# Altium footprint library PcbLib1.PcbLib: 81 footprints (part 4 of 6)
Each footprint in its own frame and in the unit in brackets; x right, y up, seen from the top. Pads: shape width x height; smd on the part's side, far side on the other; paste and mask are expansions set on the pad; w line width, h text height; cw(c..) or ccw(c..) is an arc to the next point about the centre after c.
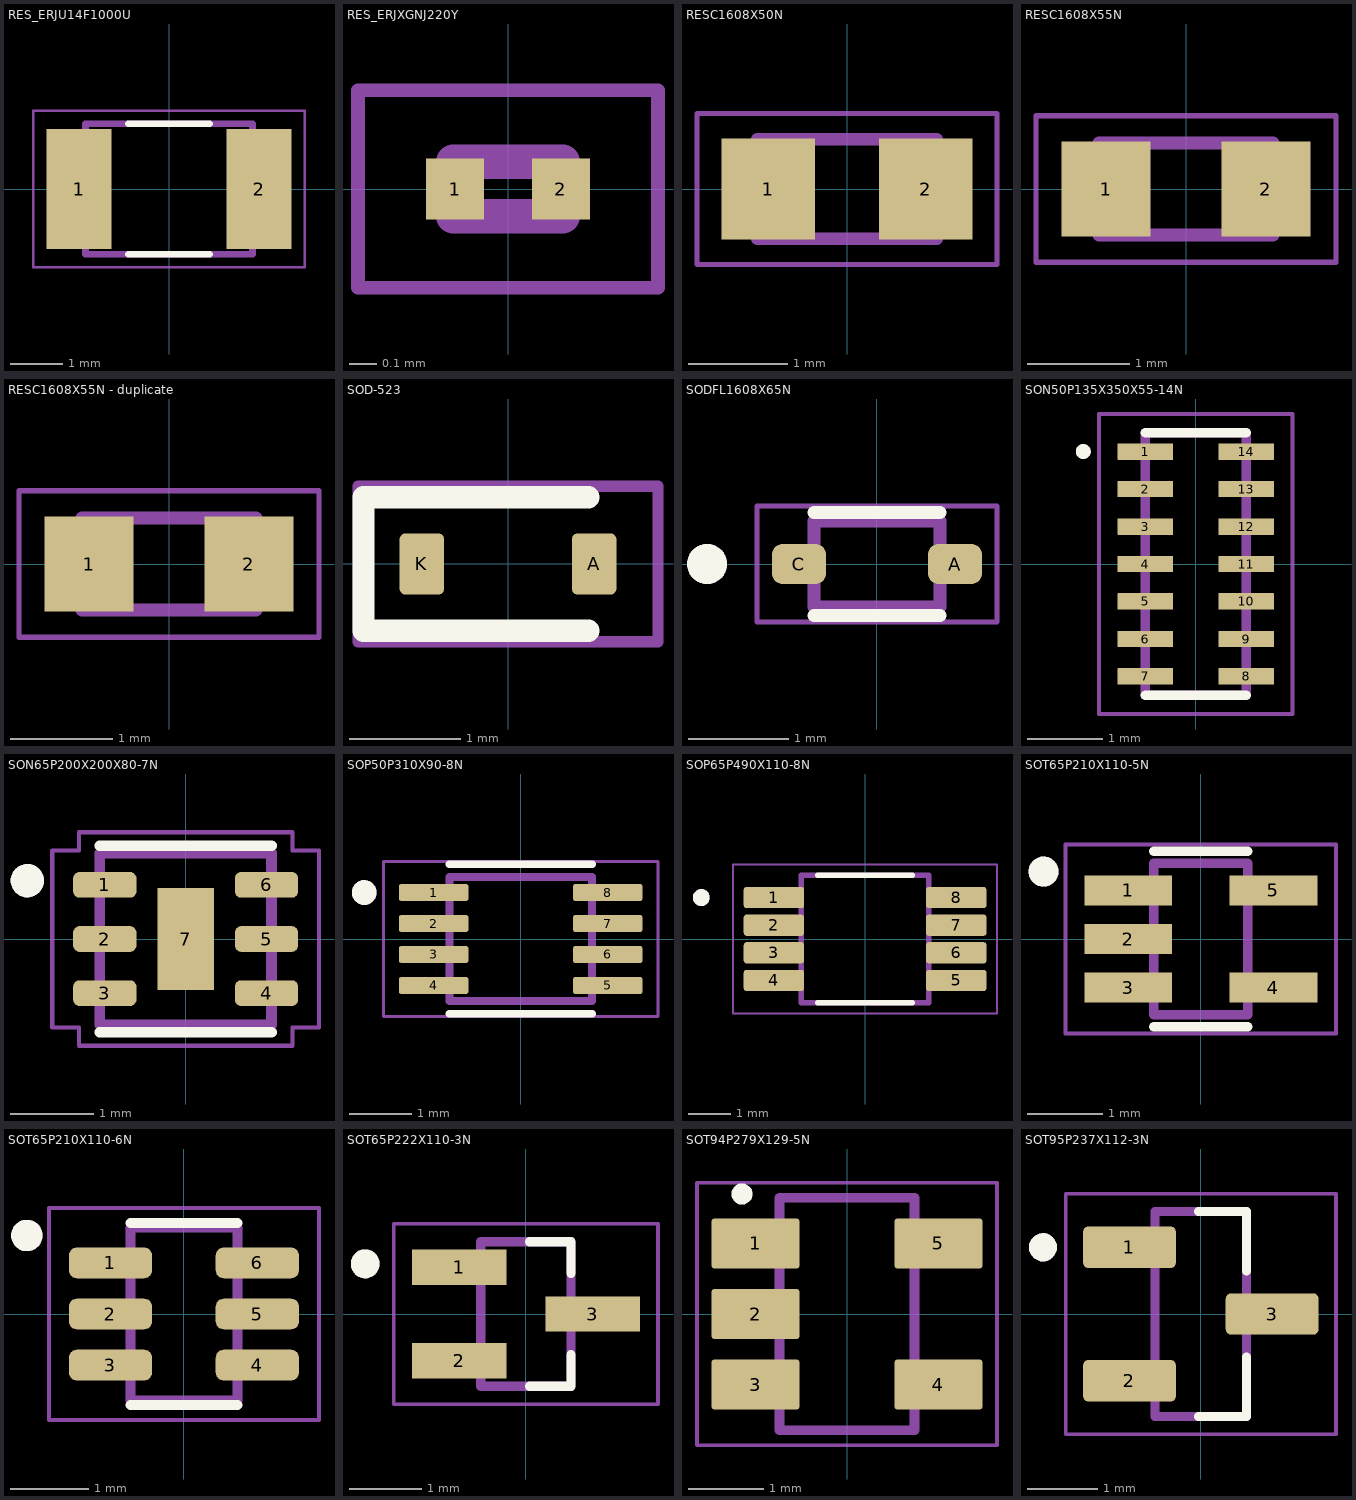
[diagram p3: the footprints below, top view; thin cyan lines are the x and y axes]

## RES_ERJU14F1000U [mm]
pads (2):
  rect 1.25x2.3 smd: 1(-1.725,0) 2(1.725,0)
Top Overlay:
  lines w0.127: -0.78,-1.25 0.78,-1.25 ; -0.78,1.25 0.78,1.25
Mechanical 13:
  lines w0.127: -1.6,-1.25 -1.6,1.25 1.6,1.25 1.6,-1.25 -1.6,-1.25
Mechanical 15:
  lines w0.05: -2.6,-1.5 -2.6,1.5 2.6,1.5 2.6,-1.5 -2.6,-1.5
3D body "ERJ-U14F1000U.STEP": height 0.6, standoff 0, extent -1.6,-1.25 1.6,1.25

## RES_ERJXGNJ220Y [mm]
pads (2):
  rect 0.212x0.225 smd: 1(-0.194,0) 2(0.194,0)
Mechanical 13:
  lines w0.127: -0.2,-0.1 0.2,-0.1 0.2,0.1 -0.2,0.1 -0.2,-0.1
Mechanical 15:
  lines w0.05: -0.55,-0.362 0.55,-0.362 0.55,0.362 -0.55,0.362 -0.55,-0.362
3D body "ERJ-XGNJ220Y.STEP": height 0.13, standoff 0, extent -0.206,-0.1 0.194,0.1

## RESC1608X50N [mm]
pads (2):
  rect 0.94x1.02 smd paste+0 mask+0.102: 1(-0.79,0) 2(0.79,0)
Mechanical 13:
  lines w0.127: -0.9,-0.5 0.9,-0.5 0.9,0.5 -0.9,0.5 -0.9,-0.5
Mechanical 15:
  lines w0.05: -1.508,-0.758 1.508,-0.758 1.508,0.758 -1.508,0.758 -1.508,-0.758
3D body "step_temp.STEP": height 0.5, standoff 0, extent -0.8,-0.4 0.8,0.4

## RESC1608X55N [mm]
pads (2):
  rect 0.87x0.93 smd: 1(-0.78,0) 2(0.78,0)
Mechanical 13:
  lines w0.127: -0.85,-0.45 0.85,-0.45 0.85,0.45 -0.85,0.45 -0.85,-0.45
Mechanical 15:
  lines w0.05: -1.465,-0.715 1.465,-0.715 1.465,0.715 -1.465,0.715 -1.465,-0.715
3D body "step_temp.STEP": height 0.55, standoff 0, extent -0.8,-0.4 0.8,0.4

## RESC1608X55N - duplicate [mm]
pads (2):
  rect 0.87x0.93 smd paste+0 mask+0.102: 1(-0.78,0) 2(0.78,0)
Mechanical 13:
  lines w0.127: -0.85,-0.45 0.85,-0.45 0.85,0.45 -0.85,0.45 -0.85,-0.45
Mechanical 15:
  lines w0.05: -1.465,-0.715 1.465,-0.715 1.465,0.715 -1.465,0.715 -1.465,-0.715
3D body "step_temp.STEP": height 0.55, standoff 0, extent -0.8,-0.4 0.8,0.4

## SOD-523 [mm] "SMD"
pads (2):
  rrect25% 0.4x0.55 smd: A(0.775,0) K(-0.775,0)
Top Overlay:
  lines w0.2: 0.725,-0.6 -1.3,-0.6 -1.3,0.6 0.725,0.6
Mechanical 15:
  lines w0.1: -1.35,-0.7 1.35,-0.7 1.35,0.7 -1.35,0.7 -1.35,-0.7
3D body "p38_SOD-523.stp": height 0.7, standoff 0, extent -0.85,-0.425 0.85,0.425

## SODFL1608X65N [mm]
pads (2):
  rrect50% 0.54x0.4 smd: A(0.78,0) C(-0.78,0)
Top Overlay:
  circle w0.2: c-1.7,0 r0.1
  lines w0.127: -0.63,-0.515 0.63,-0.515 ; -0.63,0.515 0.63,0.515
Mechanical 13:
  circle w0.2: c-1.7,0 r0.1
  lines w0.127: -0.63,-0.43 -0.63,0.43 0.63,0.43 0.63,-0.43 -0.63,-0.43
Mechanical 15:
  lines w0.05: -1.2,-0.58 -1.2,0.58 1.2,0.58 1.2,-0.58 -1.2,-0.58
3D body "step_temp.STEP": height 0.65, standoff 0, extent -0.8,-0.4 0.8,0.4

## SON50P135X350X55-14N [mm]
pads (14):
  rrect6% 0.74x0.22 smd: 1(-0.67,1.5) 2(-0.67,1) 3(-0.67,0.5) 4(-0.67,0) 5(-0.67,-0.5) 6(-0.67,-1) 7(-0.67,-1.5) 8(0.67,-1.5) 9(0.67,-1) 10(0.67,-0.5) 11(0.67,0) 12(0.67,0.5) 13(0.67,1) 14(0.67,1.5)
Top Overlay:
  circle w0.1: c-1.5,1.5 r0.05
  lines w0.127: -0.675,-1.75 0.675,-1.75 ; -0.675,1.75 0.675,1.75
Mechanical 13:
  circle w0.1: c-0.9,1.5 r0.05
  lines w0.127: -0.675,-1.75 -0.675,1.75 0.675,1.75 0.675,-1.75 -0.675,-1.75
Mechanical 15:
  lines w0.05: -1.29,-2 -1.29,2 1.29,2 1.29,-2 -1.29,-2
3D body "step_temp.STEP": height 0.55, standoff 0, extent -0.675,-1.75 0.675,1.75

## SON65P200X200X80-7N [mm]
pads (7):
  rrect50% 0.76x0.31 smd: 1(-0.97,0.65) 2(-0.97,0) 3(-0.97,-0.65) 4(0.97,-0.65) 5(0.97,0) 6(0.97,0.65)
  rect 0.675x1.225 smd paste-2: 7(0,0)
Top Overlay:
  circle w0.2: c-1.9,0.7 r0.1
  lines w0.127: -1.03,-1.12 1.03,-1.12 ; -1.03,1.12 1.03,1.12
Top Paste:
  region: 0.212,-0.487 -0.212,-0.487 -0.212,0.487 0.212,0.487
Mechanical 13:
  circle w0.2: c-1.9,0.7 r0.1
  lines w0.127: -1.03,-1.03 1.03,-1.03 1.03,1.03 -1.03,1.03 -1.03,-1.03
Mechanical 15:
  lines w0.05: -1.6,-1.06 -1.6,1.06 -1.28,1.06 -1.28,1.28 1.28,1.28 1.28,1.06 1.6,1.06 1.6,-1.06 1.28,-1.06 1.28,-1.28 -1.28,-1.28 -1.28,-1.06 -1.6,-1.06
3D body "step_temp.STEP": height 0.8, standoff 0, extent -1,-1 1,1

## SOP50P310X90-8N [mm]
pads (8):
  rrect25% 1.12x0.27 smd paste+0 mask+0.102: 1(-1.405,0.75) 2(-1.405,0.25) 3(-1.405,-0.25) 4(-1.405,-0.75) 5(1.405,-0.75) 6(1.405,-0.25) 7(1.405,0.25) 8(1.405,0.75)
Top Overlay:
  circle w0.2: c-2.525,0.75 r0.1
  lines w0.127: -1.15,-1.205 1.15,-1.205 ; -1.15,1.205 1.15,1.205
Mechanical 13:
  circle w0.2: c-2.525,0.75 r0.1
  lines w0.127: -1.15,-1 1.15,-1 1.15,1 -1.15,1 -1.15,-1
Mechanical 15:
  lines w0.05: -2.215,-1.25 2.215,-1.25 2.215,1.25 -2.215,1.25 -2.215,-1.25
3D body "step_temp.STEP": height 0.9, standoff 0, extent -1.55,-1 1.55,1

## SOP65P490X110-8N [mm]
height 1.1
pads (8):
  rrect25% 1.42x0.5 smd paste+0 mask+0.102: 1(-2.145,0.975) 2(-2.145,0.325) 3(-2.145,-0.325) 4(-2.145,-0.975) 5(2.145,-0.975) 6(2.145,-0.325) 7(2.145,0.325) 8(2.145,0.975)
Top Overlay:
  circle w0.2: c-3.855,0.975 r0.1
  lines w0.127: -1.115,-1.5 1.115,-1.5 ; -1.115,1.5 1.115,1.5
Mechanical 13:
  circle w0.2: c-3.855,0.975 r0.1
  lines w0.127: -1.5,-1.5 1.5,-1.5 1.5,1.5 -1.5,1.5 -1.5,-1.5
Mechanical 15:
  lines w0.05: -3.105,-1.75 -3.105,1.75 3.105,1.75 3.105,-1.75 -3.105,-1.75
3D body "step_temp.STEP": height 1.1, standoff 0, extent -2.45,-1.5 2.45,1.5

## SOT65P210X110-5N [mm]
height 1.1
pads (5):
  rect 1.17x0.4 smd paste+0 mask+0.102: 1(-0.97,0.65) 2(-0.97,0) 3(-0.97,-0.65) 4(0.97,-0.65) 5(0.97,0.65)
Top Overlay:
  circle w0.2: c-2.1,0.9 r0.1
  lines w0.127: -0.625,-1.17 0.625,-1.17 ; -0.625,1.17 0.625,1.17
Mechanical 13:
  circle w0.2: c-2.1,0.9 r0.1
  lines w0.127: -0.625,-1.012 -0.625,1.012 0.625,1.012 0.625,-1.012 -0.625,-1.012
Mechanical 15:
  lines w0.05: -1.805,-1.262 -1.805,1.262 1.805,1.262 1.805,-1.262 -1.805,-1.262
3D body "step_temp.STEP": height 1.1, standoff 0, extent -1.05,-1 1.05,1

## SOT65P210X110-6N [mm]
pads (6):
  rrect50% 1.06x0.39 smd: 1(-0.935,0.65) 2(-0.935,0) 3(-0.935,-0.65) 4(0.935,-0.65) 5(0.935,0) 6(0.935,0.65)
Top Overlay:
  circle w0.2: c-2,1 r0.1
  lines w0.127: -0.68,-1.159 0.68,-1.159 ; -0.68,1.159 0.68,1.159
Mechanical 13:
  circle w0.2: c-2,1 r0.1
  lines w0.127: -0.68,-1.1 -0.68,1.1 0.68,1.1 0.68,-1.1 -0.68,-1.1
Mechanical 15:
  lines w0.05: -1.72,-1.35 -1.72,1.35 1.72,1.35 1.72,-1.35 -1.72,-1.35
3D body "step_temp.STEP": height 1.1, standoff 0, extent -1.05,-1 1.05,1

## SOT65P222X110-3N [mm]
height 1.1
pads (3):
  rect 1.31x0.49 smd: 1(-0.925,0.65) 2(-0.925,-0.65) 3(0.925,0)
Top Overlay:
  circle w0.2: c-2.225,0.695 r0.1
  lines w0.127: 0.05,-1 0.625,-1 0.625,-0.565 ; 0.05,1 0.625,1 0.625,0.565
Mechanical 13:
  circle w0.2: c-2.225,0.695 r0.1
  lines w0.127: -0.625,-1 0.625,-1 0.625,1 -0.625,1 -0.625,-1
Mechanical 15:
  lines w0.05: -1.83,-1.25 1.83,-1.25 1.83,1.25 -1.83,1.25 -1.83,-1.25
3D body "step_temp.STEP": height 1.1, standoff 0, extent -1.05,-1.075 1.05,1.075

## SOT94P279X129-5N [mm]
pads (5):
  rrect12% 1.17x0.67 smd: 1(-1.22,0.94) 2(-1.22,0) 3(-1.22,-0.94) 4(1.22,-0.94) 5(1.22,0.94)
Top Overlay:
  circle w0.14: c-1.4,1.6 r0.07
Mechanical 13:
  lines w0.127: -0.9,-1.55 -0.9,1.55 0.9,1.55 0.9,-1.55 -0.9,-1.55
Mechanical 15:
  lines w0.05: -2,-1.75 2,-1.75 2,1.75 -2,1.75 -2,-1.75
3D body "step_temp.STEP": height 1.3, standoff 0, extent -1.397,-1.448 1.397,1.448

## SOT95P237X112-3N [mm]
height 1.12
pads (3):
  rrect25% 1.32x0.59 smd: 1(-1.015,0.95) 2(-1.015,-0.95) 3(1.015,0)
Top Overlay:
  circle w0.2: c-2.246,0.95 r0.1
  lines w0.127: -0.035,-1.46 0.65,-1.46 0.65,-0.615 ; -0.035,1.46 0.65,1.46 0.65,0.615
Mechanical 13:
  circle w0.2: c-2.246,0.95 r0.1
  lines w0.127: -0.65,-1.46 0.65,-1.46 0.65,1.46 -0.65,1.46 -0.65,-1.46
Mechanical 15:
  lines w0.05: -1.925,-1.71 1.925,-1.71 1.925,1.71 -1.925,1.71 -1.925,-1.71
3D body "step_temp.STEP": height 1.12, standoff 0, extent -1.188,-1.46 1.188,1.46